# Altium footprint library Airscout_PCB_Lib.PcbLib: 44 footprints (part 3 of 3)
Each footprint in its own frame and in the unit in brackets; x right, y up, seen from the top. Pads: shape width x height; smd on the part's side, far side on the other; paste and mask are expansions set on the pad; w line width, h text height; cw(c..) or ccw(c..) is an arc to the next point about the centre after c.
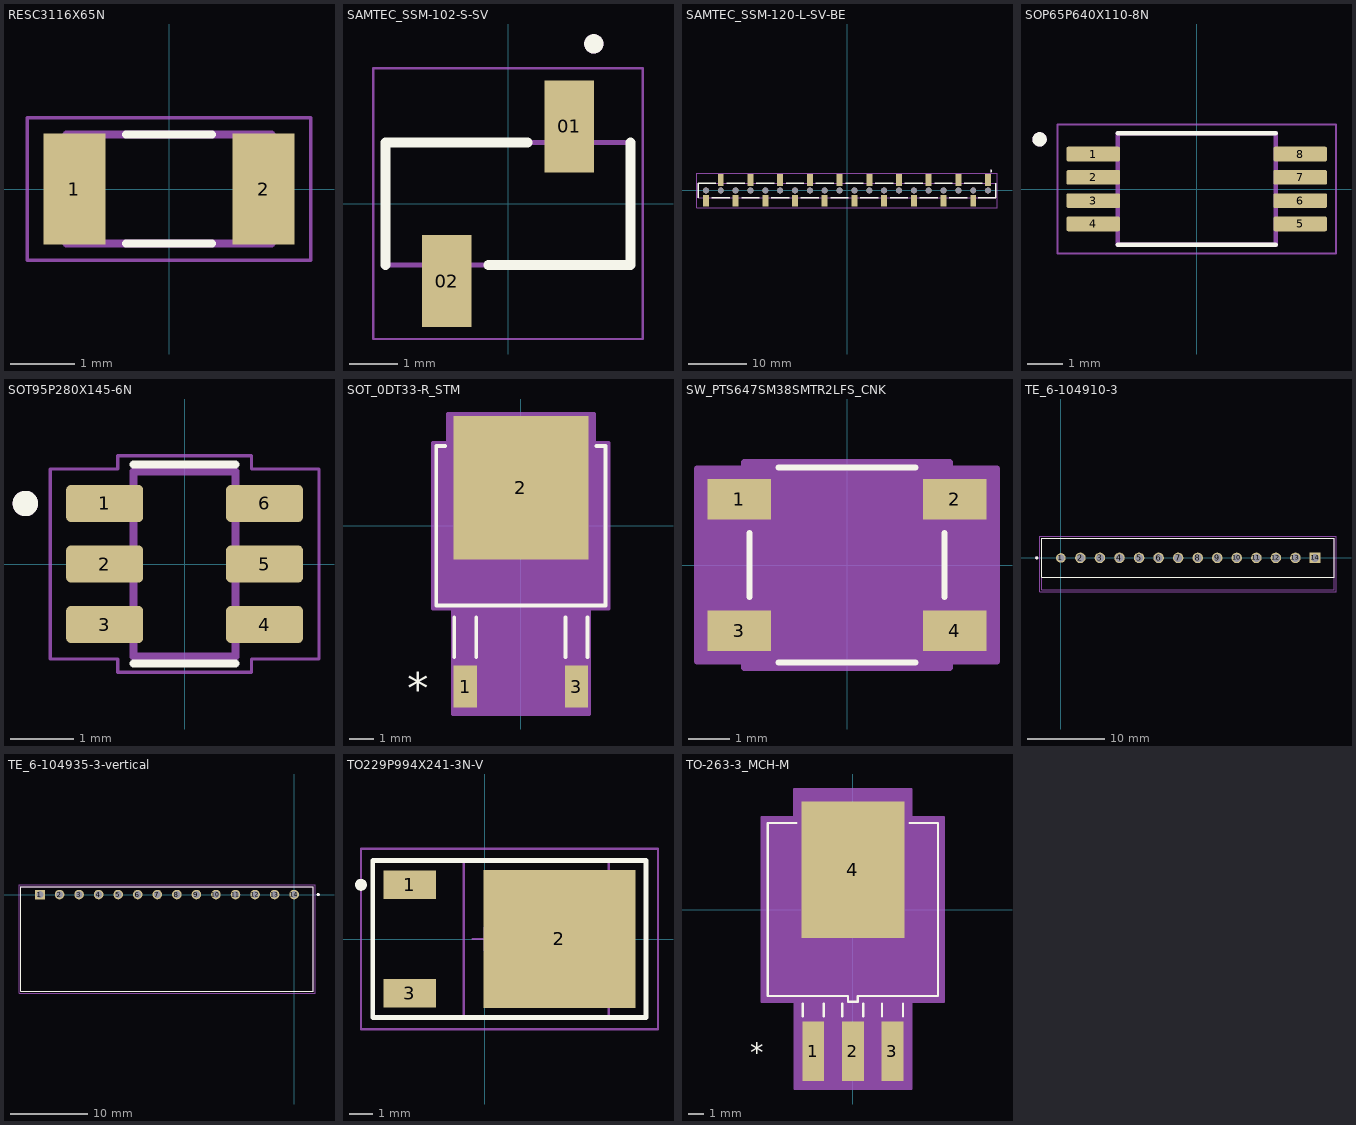
[diagram p2: the footprints below, top view; thin cyan lines are the x and y axes]

## RESC3116X65N [mm] "Caseform: 1206 Imperial"
pads (2):
  rect 0.97x1.73 smd: 1(-1.48,0) 2(1.48,0)
Top Overlay:
  lines w0.127: -0.67,-0.85 0.67,-0.85 ; -0.67,0.85 0.67,0.85
Mechanical 13:
  lines w0.127: -1.6,-0.85 -1.6,0.85 1.6,0.85 1.6,-0.85 -1.6,-0.85
Mechanical 15:
  lines w0.05: -2.215,-1.115 -2.215,1.115 2.215,1.115 2.215,-1.115 -2.215,-1.115
3D body "step_temp.STEP": height 0.65, standoff 0, extent -1.55,-0.8 1.55,0.8

## SAMTEC_SSM-102-S-SV [mm]
pads (2):
  rect 1.02x1.905 smd: 01(1.27,1.603) 02(-1.27,-1.603)
Top Overlay:
  circle w0.2: c1.78,3.315 r0.1
  lines w0.2: -2.54,-1.27 -2.54,1.27 0.41,1.27 ; -0.41,-1.27 2.54,-1.27 2.54,1.27
Mechanical 13:
  circle w0.2: c1.78,3.315 r0.1
  lines w0.1: -2.54,-1.27 -2.54,1.27 2.54,1.27 2.54,-1.27 -2.54,-1.27
Mechanical 15:
  lines w0.05: -2.79,-2.805 -2.79,2.805 2.79,2.805 2.79,-2.805 -2.79,-2.805
3D body "SSM-102-S-SV.stp": height 7.37, standoff -0.13, extent -2.54,-2.286 2.54,2.286

## SAMTEC_SSM-120-L-SV-BE [mm]
pads (40):
  rect 1.02x2 smd: 01(24.13,1.778) 02(21.59,-1.778) 03(19.05,1.778) 04(16.51,-1.778) 05(13.97,1.778) 06(11.43,-1.778) 07(8.89,1.778) 08(6.35,-1.778) 09(3.81,1.778) 10(1.27,-1.778) 11(-1.27,1.778) 12(-3.81,-1.778) 13(-6.35,1.778) 14(-8.89,-1.778) 15(-11.43,1.778) 16(-13.97,-1.778) 17(-16.51,1.778) 18(-19.05,-1.778) 19(-21.59,1.778) 20(-24.13,-1.778)
  round 1.02 hole 1.02 unplated: ""(-24.13,0) ""(-21.59,0) ""(-19.05,0) ""(-16.51,0) ""(-13.97,0) ""(-11.43,0) ""(-8.89,0) ""(-6.35,0) ""(-3.81,0) ""(-1.27,0) ""(1.27,0) ""(3.81,0) ""(6.35,0) ""(8.89,0) ""(11.43,0) ""(13.97,0) ""(16.51,0) ""(19.05,0) ""(21.59,0) ""(24.13,0)
Top Overlay:
  circle w0.2: c24.64,3.315 r0.1
  lines w0.254: -25.4,-1.27 -25.4,1.27 -22.45,1.27 ; -23.114,-1.27 -20.066,-1.27 ; -20.574,1.27 -17.526,1.27 ; -18.034,-1.27 -14.986,-1.27 ; -15.494,1.27 -12.446,1.27 ; -12.954,-1.27 -9.906,-1.27 ; -10.414,1.27 -7.366,1.27 ; -7.874,-1.27 -4.826,-1.27 ; -5.334,1.27 -2.286,1.27 ; -2.794,-1.27 0.254,-1.27 ; -0.254,1.27 2.794,1.27 ; 2.286,-1.27 5.334,-1.27 ; 4.826,1.27 7.874,1.27 ; 7.366,-1.27 10.414,-1.27 ; 9.906,1.27 12.954,1.27 ; 12.446,-1.27 15.494,-1.27 ; 14.986,1.27 18.034,1.27 ; 17.526,-1.27 20.574,-1.27 ; 20.066,1.27 23.114,1.27 ; 22.45,-1.27 25.4,-1.27 25.4,1.27
Mechanical 13:
  circle w0.2: c24.64,3.315 r0.1
  lines w0.1: -25.4,-1.27 -25.4,1.27 25.4,1.27 25.4,-1.27 -25.4,-1.27
Mechanical 15:
  lines w0.05: -25.65,-2.921 -25.65,2.921 25.65,2.921 25.65,-2.921 -25.65,-2.921
3D body "SSM-120-L-SV-BE-K-TR.stp": height 7.52, standoff -0.1, extent -25.4,-2.413 25.4,2.159

## SOP65P640X110-8N [mm]
pads (8):
  rrect25% 1.5x0.41 smd mask+0.065: 1(-2.885,0.975) 2(-2.885,0.325) 3(-2.885,-0.325) 4(-2.885,-0.975) 5(2.885,-0.975) 6(2.885,-0.325) 7(2.885,0.325) 8(2.885,0.975)
Top Overlay:
  circle w0.2: c-4.385,1.385 r0.1
  lines w0.127: -2.2,-1.55 2.2,-1.55 ; -2.2,1.55 2.2,1.55
Mechanical 13:
  circle w0.2: c-4.385,1.385 r0.1
  lines w0.127: -2.2,-1.55 2.2,-1.55 2.2,1.55 -2.2,1.55 -2.2,-1.55
Mechanical 15:
  lines w0.05: -3.885,-1.8 3.885,-1.8 3.885,1.8 -3.885,1.8 -3.885,-1.8
3D body "TSSOP8.STEP": height 1, standoff 0, extent -3.2,-1.5 3.2,1.5

## SOT95P280X145-6N [mm]
pads (6):
  rrect25% 1.21x0.58 smd: 1(-1.255,0.95) 2(-1.255,0) 3(-1.255,-0.95) 4(1.255,-0.95) 5(1.255,0) 6(1.255,0.95)
Top Overlay:
  circle w0.2: c-2.5,0.95 r0.1
  lines w0.127: -0.8,-1.56 0.8,-1.56 ; -0.8,1.56 0.8,1.56
Mechanical 13:
  circle w0.2: c-2.5,0.95 r0.1
  lines w0.127: -0.8,-1.45 0.8,-1.45 0.8,1.45 -0.8,1.45 -0.8,-1.45
Mechanical 15:
  lines w0.05: -2.11,-1.49 -1.05,-1.49 -1.05,-1.7 1.05,-1.7 1.05,-1.49 2.11,-1.49 2.11,1.49 1.05,1.49 1.05,1.7 -1.05,1.7 -1.05,1.49 -2.11,1.49 -2.11,-1.49
3D body "step_temp.STEP": height 1.45, standoff 0, extent -1.4,-1.45 1.4,1.45

## SOT_0DT33-R_STM [mil]
pads (3):
  rect 37x67 smd paste+0 mask+0: 1(-88.58,-256.5) 3(88.58,-256.5)
  rect 215x229 smd paste+0 mask+0: 2(0,60.5)
Top Overlay:
  lines w6: -120.6,127 -135,127 -135,-127 135,-127 135,127 120.6,127 ; -106.08,-209 -106.08,-146 ; -71.08,-209 -71.08,-146 ; 71.08,-209 71.08,-146 ; 106.08,-209 106.08,-146
  text "*" at -181.1,-283.46 h50
Mechanical 13:
  lines w1: -130,-122 -130,122 130,122 130,-122 -130,-122 ; -106.08,-276 -71.08,-276 -71.08,-122 -106.08,-122 -106.08,-276 ; 71.08,-276 106.08,-276 106.08,-122 71.08,-122 71.08,-276
  text "*" at -181.1,-283.46 h50
Mechanical 15:
  region: -140,-132 -140,132 -116.5,132 -116.5,178 116.5,178 116.5,132 140,132 140,-132 108.58,-132 108.58,-300 -108.58,-300 -108.58,-132
  lines w6: -140,-132 -108.58,-132 -108.58,-300 108.58,-300 108.58,-132 140,-132 140,132 116.5,132 116.5,178 -116.5,178 -116.5,132 -140,132 -140,-132
3D body "SOT_0DT33-R_STM.step": height 94.09, standoff -2.01, extent -130,-275.98 130,154.02

## SW_PTS647SM38SMTR2LFS_CNK [mm]
pads (4):
  rect 1.549x0.991 smd paste+0 mask+0: 1(-2.625,1.6) 2(2.625,1.6) 3(-2.625,-1.6) 4(2.625,-1.6)
Top Overlay:
  lines w0.152: -2.375,-0.772 -2.375,0.772 ; -1.67,-2.375 1.67,-2.375 ; -1.67,2.375 1.67,2.375 ; 2.375,-0.772 2.375,0.772
Mechanical 13:
  lines w0: -0.305,2.248 ccw(c0,2.248) 0.305,2.248
  lines w0.025: -2.248,-2.248 2.248,-2.248 2.248,2.248 -2.248,2.248 -2.248,-2.248
Mechanical 15:
  region: -2.502,-2.349 -3.654,-2.349 -3.654,2.349 -2.502,2.349 -2.502,2.502 2.502,2.502 2.502,2.349 3.654,2.349 3.654,-2.349 2.502,-2.349 2.502,-2.502 -2.502,-2.502
  lines w0.152: -3.654,-2.349 -3.654,2.349 -2.502,2.349 -2.502,2.502 2.502,2.502 2.502,2.349 3.654,2.349 3.654,-2.349 2.502,-2.349 2.502,-2.502 -2.502,-2.502 -2.502,-2.349 -3.654,-2.349
3D body "SW_PTS647SM38SMTR2LFS_CNK.step": height 3.81, standoff 0, extent -3.05,-2.248 3.05,2.248

## TE_6-104910-3 [mm]
pads (14):
  round 1.24 hole 0.89: 1(0,0)
  round 1.37 hole 1.02: 2(2.54,0) 3(5.08,0) 4(7.62,0) 5(10.16,0) 6(12.7,0) 7(15.24,0) 8(17.78,0) 9(20.32,0) 10(22.86,0) 11(25.4,0) 12(27.94,0) 13(30.48,0)
  rect 1.37x1.37 hole 1.02: 14(33.02,0)
Top Overlay:
  circle w0.2: c-3.125,0 r0.1
  lines w0.127: -2.475,-2.54 35.495,-2.54 35.495,2.54 -2.475,2.54 -2.475,-2.54
Mechanical 13:
  circle w0.2: c-3.125,0 r0.1
  lines w0.127: -2.475,-2.54 -2.475,-4.12 35.495,-4.12 35.495,-2.54 ; -2.475,-2.54 35.495,-2.54 ; -2.475,-2.54 -2.475,2.54 35.495,2.54 35.495,-2.54
Mechanical 15:
  lines w0.05: -2.725,-4.37 35.745,-4.37 35.745,2.79 -2.725,2.79 -2.725,-4.37
3D body "705430013.stp": height 11.43, standoff -3.68, extent -2.54,-4.064 35.56,2.54

## TE_6-104935-3-vertical [mm]
pads (14):
  rect 1.24x1.24 hole 0.89: 1(-33.02,0)
  round 1.24 hole 0.89: 2(-30.48,0) 3(-27.94,0) 4(-25.4,0) 5(-22.86,0) 6(-20.32,0) 7(-17.78,0) 8(-15.24,0) 9(-12.7,0) 10(-10.16,0) 11(-7.62,0) 12(-5.08,0) 13(-2.54,0) 14(0,0)
Top Overlay:
  circle w0.2: c3.125,0 r0.1
  lines w0.127: -35.495,-12.57 -35.495,1.02 2.475,1.02 2.475,-12.57 -35.495,-12.57
Mechanical 13:
  circle w0.2: c3.125,0 r0.1
  lines w0.127: -35.495,-12.57 -35.495,1.02 2.475,1.02 2.475,-12.57 ; -35.495,-12.57 2.475,-12.57 ; -35.495,-12.57 2.475,-12.57
Mechanical 15:
  lines w0.05: -35.745,-12.82 -35.745,1.27 2.725,1.27 2.725,-12.82 -35.745,-12.82
3D body "705530013--3DModel-STEP-510211.STEP": height 6.98, standoff -3.3, extent -35.56,-12.763 2.54,0.826

## TO229P994X241-3N-V [mm] "TO,2.29mm pitch;2 pin,9.94mm L X 6.095mm W X 2.41mm H body"
height 2.41
pads (3):
  rect 2.2x1.2 smd paste+0 mask+0: 1(-3.15,2.28) 3(-3.15,-2.28)
  rect 6.4x5.8 smd paste+0 mask+0: 2(3.15,0)
Top Overlay:
  circle w0.25: c-5.2,2.28 r0.125
  lines w0.2: -4.7,-3.3 6.8,-3.3 6.8,3.3 -4.7,3.3 -4.7,-3.3
Mechanical 3:
  text ".DESIGNATOR" at 0,0 h1.2
Mechanical 13:
  lines w0.1: -0.875,-3.282 5.22,-3.282 5.22,3.282 -0.875,3.282 -0.875,-3.282
Mechanical 15:
  lines w0.1: -0.5,0 0.5,0 ; 0,-0.5 0,0.5 ; -5.2,-3.8 -5.2,3.8 7.3,3.8 7.3,-3.8 -5.2,-3.8
3D body "PG-TO252-3-311.stp": height 2.36, standoff 0, extent -3.94,-3.25 6.04,3.25

## TO-263-3_MCH-M [mil]
pads (4):
  rect 55x150 smd paste+0 mask+0: 1(-100,-358.5) 2(0,-358.5) 3(100,-358.5)
  rect 260x345 smd paste+0 mask+0: 4(0,101)
Top Overlay:
  lines w6: -143.1,218.5 -215,218.5 -215,-218.5 -12.5,-218.5 -12.5,-233.5 12.5,-233.5 12.5,-218.5 215,-218.5 215,218.5 143.1,218.5 ; -126.5,-269.5 -126.5,-237.5 ; -73.5,-269.5 -73.5,-237.5 ; -26.5,-269.5 -26.5,-237.5 ; 26.5,-269.5 26.5,-237.5 ; 73.5,-269.5 73.5,-237.5 ; 126.5,-269.5 126.5,-237.5
  text "*" at -259.84,-385.83 h50
Mechanical 13:
  lines w1: -210,-213.5 -210,213.5 210,213.5 210,-213.5 -210,-213.5 ; -126.5,-411.5 -73.5,-411.5 -73.5,-213.5 -126.5,-213.5 -126.5,-411.5 ; -26.5,-411.5 26.5,-411.5 26.5,-213.5 -26.5,-213.5 -26.5,-411.5 ; -7.5,-228.5 7.5,-228.5 7.5,-213.5 -7.5,-213.5 -7.5,-228.5 ; 73.5,-411.5 126.5,-411.5 126.5,-213.5 73.5,-213.5 73.5,-411.5
  text "*" at -259.84,-385.83 h50
Mechanical 15:
  region: -230,-233.5 -230,233.5 -148,233.5 -148,304.5 148,304.5 148,233.5 230,233.5 230,-233.5 147.5,-233.5 147.5,-453.5 -147.5,-453.5 -147.5,-233.5
  lines w6: -230,-233.5 -147.5,-233.5 -147.5,-453.5 147.5,-453.5 147.5,-233.5 230,-233.5 230,233.5 148,233.5 148,304.5 -148,304.5 -148,233.5 -230,233.5 -230,-233.5
3D body "TO-263-3_MCH.step": height 181.1, standoff -2.01, extent -210,-411.5 210,253.5

## TP4056 USB_C Charging Module [mm]